# Altium schematic symbol library LATTICEPLDS_Library.SchLib: 291 symbols (part 7 of 32) (continued)
## LCMXO640/1200/2280-FT256/FTN256 (continued)
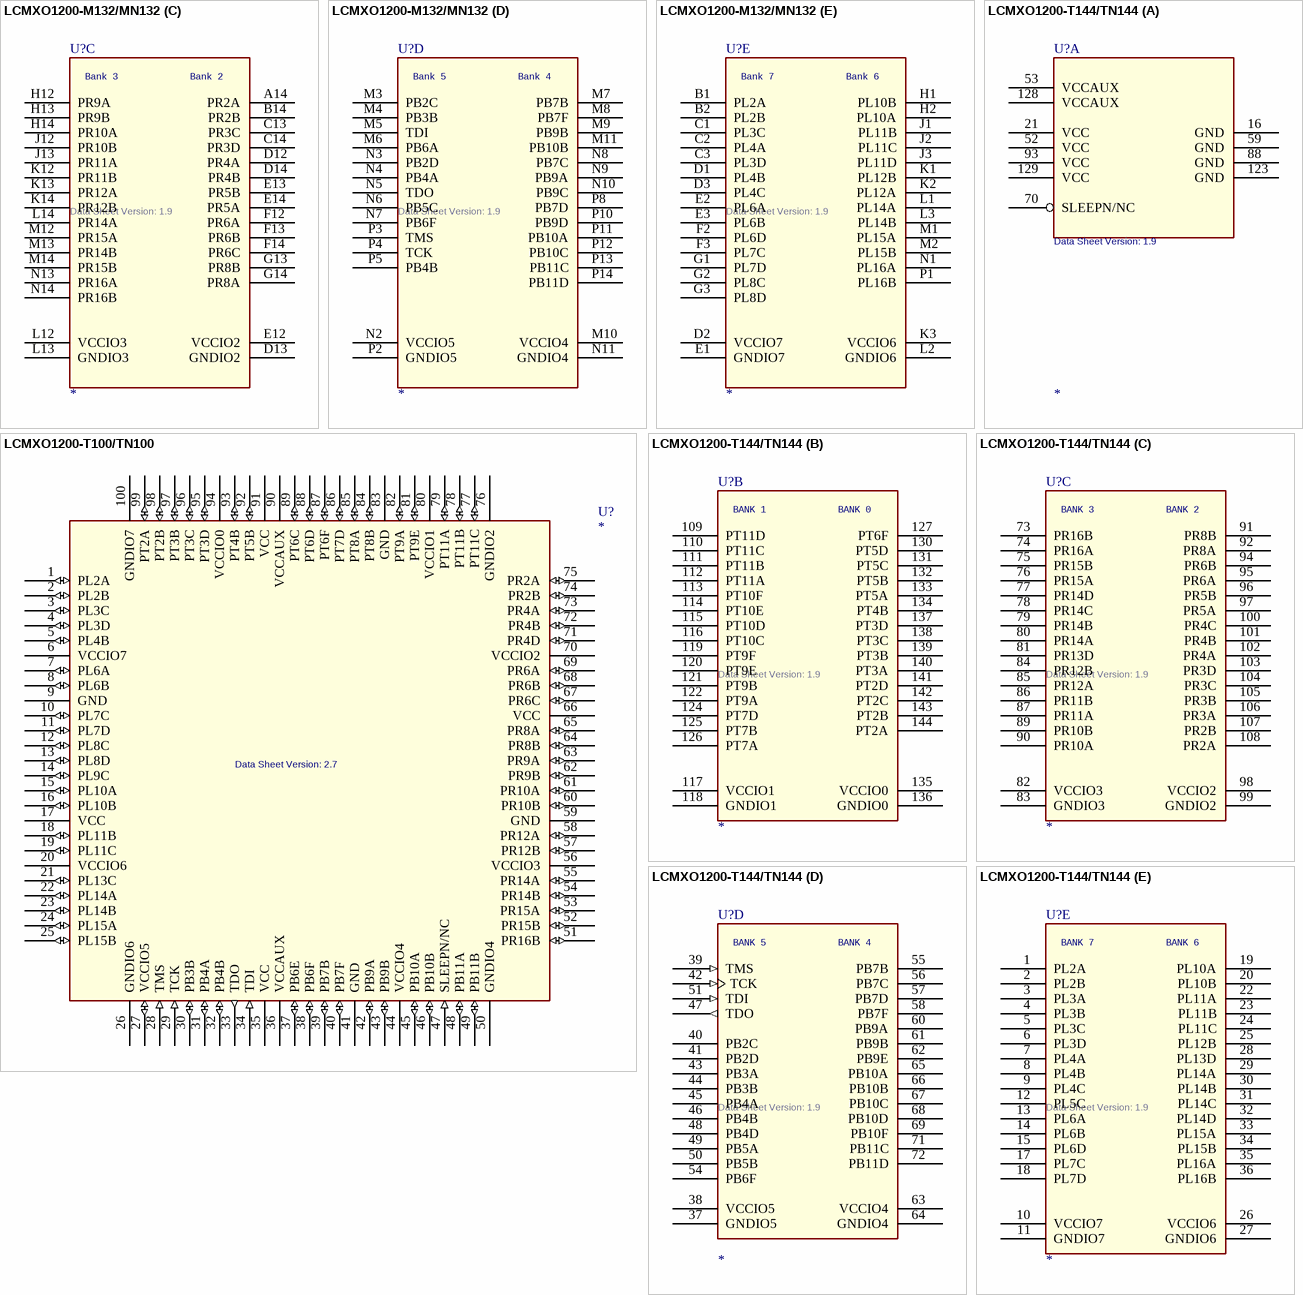
[diagram p72: symbols LCMXO1200-M132/MN132 to LCMXO1200-T144/TN144]
part A text: VCCIO0; VCCIO1; Pin name sequence / PT(640,1200,2280); I/Os in Bank 0 / for XO1200; I/Os in Bank 1 / for XO2280
part B text: VCCIO7; VCCIO6; Pin name sequence / PL(640,1200,2280)
part C text: VCCIO5; VCCIO4; Pin name sequence / PB(640,1200,2280); I/Os in Bank 5 / for XO1200; I/Os in Bank 4 / for XO2280
part D text: VCCIO2; VCCIO3; Pin name sequence / PR(640,1200,2280)
part E text: XO_640 common VCCIO; VCCJ on VCCIO5

## LCMXO1200-M132/MN132
designator U?  Data Sheet Version: 1.9
SWAP_INFO: (S1+S2+S3+S4+S5); SPLIT_INST: TRUE
part A pins: A7 VCCAUX (power), C7 VCC (power), C9 GND (power), F1 GND (power), G12 VCC (power), H3 VCC (power), J14 GND (power), N12 SLEEPN/NC, P6 VCC (power), P7 VCCAUX (power), P9 GND (power)
part B pins: A1 PT2A, A2 PT2B, A3 PT3B, A4 PT3D, A5 PT4B, A6 PT5D, A8 PT7D, A9 PT9A, A10 GNDIO1 (power), A11 PT10D, A12 PT11B, A13 PT11D, B3 PT3A, B4 GNDIO0 (power), B5 PT5A, B6 PT5C, B7 PT6D, B8 PT7B, B9 PT9B, B10 PT9F, B11 VCCIO1, B12 PT10F, B13 PT11C, C4 PT3C, C5 VCCIO0, C6 PT5B, C8 PT6F, C10 PT9E, C11 PT10C, C12 PT11A
part C pins: A14 PR2A, B14 PR2B, C13 PR3C, C14 PR3D, D12 PR4A, D13 GNDIO2 (power), D14 PR4B, E12 VCCIO2, E13 PR5B, E14 PR5A, F12 PR6A, F13 PR6B, F14 PR6C, G13 PR8B, G14 PR8A, H12 PR9A, H13 PR9B, H14 PR10A, J12 PR10B, J13 PR11A, K12 PR11B, K13 PR12A, K14 PR12B, L12 VCCIO3, L13 GNDIO3 (power), L14 PR14A, M12 PR15A, M13 PR14B, M14 PR15B, N13 PR16A, N14 PR16B
part D pins: M3 PB2C, M4 PB3B, M5 TDI, M6 PB6A, M7 PB7B, M8 PB7F, M9 PB9B, M10 VCCIO4, M11 PB10B, N2 VCCIO5, N3 PB2D, N4 PB4A, N5 TDO, N6 PB5C, N7 PB6F, N8 PB7C, N9 PB9A, N10 PB9C, N11 GNDIO4 (power), P2 GNDIO5 (power), P3 TMS, P4 TCK, P5 PB4B, P8 PB7D, P10 PB9D, P11 PB10A, P12 PB10C, P13 PB11C, P14 PB11D
part E pins: B1 PL2A, B2 PL2B, C1 PL3C, C2 PL4A, C3 PL3D, D1 PL4B, D2 VCCIO7, D3 PL4C, E1 GNDIO7 (power), E2 PL6A, E3 PL6B, F2 PL6D, F3 PL7C, G1 PL7D, G2 PL8C, G3 PL8D, H1 PL10B, H2 PL10A, J1 PL11B, J2 PL11C, J3 PL11D, K1 PL12B, K2 PL12A, K3 VCCIO6, L1 PL14A, L2 GNDIO6 (power), L3 PL14B, M1 PL15A, M2 PL15B, N1 PL16A, P1 PL16B
part B text: Bank 1; Bank 0
part C text: Bank 3; Bank 2
part D text: Bank 5; Bank 4
part E text: Bank 7; Bank 6

## LCMXO1200-T100/TN100
designator U?  Data Sheet Version: 2.7
pins: 1 PL2A (io), 2 PL2B (io), 3 PL3C (io), 4 PL3D (io), 5 PL4B (io), 6 VCCIO7 (power), 7 PL6A (io), 8 PL6B (io), 9 GND (power), 10 PL7C (io), 11 PL7D (io), 12 PL8C (io), 13 PL8D (io), 14 PL9C (io), 15 PL10A (io), 16 PL10B (io), 17 VCC (power), 18 PL11B (io), 19 PL11C (io), 20 VCCIO6 (power), 21 PL13C (io), 22 PL14A (io), 23 PL14B (io), 24 PL15A (io), 25 PL15B (io), 26 GNDIO6 (power), 27 VCCIO5 (io), 28 TMS (in), 29 TCK (in), 30 PB3B (io), 31 PB4A (io), 32 PB4B (io), 33 TDO (out), 34 TDI (in), 35 VCC (power), 36 VCCAUX (power), 37 PB6E (io), 38 PB6F (io), 39 PB7B (io), 40 PB7F (io), 41 GND (power), 42 PB9A (io), 43 PB9B (io), 44 VCCIO4 (power), 45 PB10A (io), 46 PB10B (io), 47 SLEEPN/NC (in), 48 PB11A (io), 49 PB11B (io), 50 GNDIO4 (power), 51 PR16B (io), 52 PR15B (io), 53 PR15A (io), 54 PR14B (io), 55 PR14A (io), 56 VCCIO3 (power), 57 PR12B (io), 58 PR12A (io), 59 GND (power), 60 PR10B (io), 61 PR10A (io), 62 PR9B (io), 63 PR9A (io), 64 PR8B (io), 65 PR8A (io), 66 VCC (power), 67 PR6C (io), 68 PR6B (io), 69 PR6A (io), 70 VCCIO2 (power), 71 PR4D (io), 72 PR4B (io), 73 PR4A (io), 74 PR2B (io), 75 PR2A (io), 76 GNDIO2 (power), 77 PT11C (io), 78 PT11B (io), 79 PT11A (io), 80 VCCIO1 (power), 81 PT9E (io), 82 PT9A (io), 83 GND (power), 84 PT8B (io), 85 PT8A (io), 86 PT7D (io), 87 PT6F (io), 88 PT6D (io), 89 PT6C (io), 90 VCCAUX (power), 91 VCC (power), 92 PT5B (io), 93 PT4B (io), 94 VCCIO0 (power), 95 PT3D (io), 96 PT3C (io), 97 PT3B (io), 98 PT2B (io), 99 PT2A (io), 100 GNDIO7 (power)

## LCMXO1200-T144/TN144
designator U?  Data Sheet Version: 1.9
SWAP_INFO: (S1+S2+S3+S4+S5); SPLIT_INST: TRUE
part A pins: 16 GND (power), 21 VCC (power), 52 VCC (power), 53 VCCAUX (power), 59 GND (power), 70 SLEEPN/NC, 88 GND (power), 93 VCC (power), 123 GND (power), 128 VCCAUX (power), 129 VCC (power)
part B pins: 109 PT11D, 110 PT11C, 111 PT11B, 112 PT11A, 113 PT10F, 114 PT10E, 115 PT10D, 116 PT10C, 117 VCCIO1, 118 GNDIO1 (power), 119 PT9F, 120 PT9E, 121 PT9B, 122 PT9A, 124 PT7D, 125 PT7B, 126 PT7A, 127 PT6F, 130 PT5D, 131 PT5C, 132 PT5B, 133 PT5A, 134 PT4B, 135 VCCIO0, 136 GNDIO0 (power), 137 PT3D, 138 PT3C, 139 PT3B, 140 PT3A, 141 PT2D, 142 PT2C, 143 PT2B, 144 PT2A
part C pins: 73 PR16B, 74 PR16A, 75 PR15B, 76 PR15A, 77 PR14D, 78 PR14C, 79 PR14B, 80 PR14A, 81 PR13D, 82 VCCIO3, 83 GNDIO3 (power), 84 PR12B, 85 PR12A, 86 PR11B, 87 PR11A, 89 PR10B, 90 PR10A, 91 PR8B, 92 PR8A, 94 PR6B, 95 PR6A, 96 PR5B, 97 PR5A, 98 VCCIO2, 99 GNDIO2 (power), 100 PR4C, 101 PR4B, 102 PR4A, 103 PR3D, 104 PR3C, 105 PR3B, 106 PR3A, 107 PR2B, 108 PR2A
part D pins: 37 GNDIO5 (power), 38 VCCIO5, 39 TMS (in), 40 PB2C, 41 PB2D, 42 TCK (in), 43 PB3A, 44 PB3B, 45 PB4A, 46 PB4B, 47 TDO (out), 48 PB4D, 49 PB5A, 50 PB5B, 51 TDI (in), 54 PB6F, 55 PB7B, 56 PB7C, 57 PB7D, 58 PB7F, 60 PB9A, 61 PB9B, 62 PB9E, 63 VCCIO4, 64 GNDIO4 (power), 65 PB10A, 66 PB10B, 67 PB10C, 68 PB10D, 69 PB10F, 71 PB11C, 72 PB11D
part E pins: 1 PL2A, 2 PL2B, 3 PL3A, 4 PL3B, 5 PL3C, 6 PL3D, 7 PL4A, 8 PL4B, 9 PL4C, 10 VCCIO7, 11 GNDIO7 (power), 12 PL5C, 13 PL6A, 14 PL6B, 15 PL6D, 17 PL7C, 18 PL7D, 19 PL10A, 20 PL10B, 22 PL11A, 23 PL11B, 24 PL11C, 25 PL12B, 26 VCCIO6, 27 GNDIO6 (power), 28 PL13D, 29 PL14A, 30 PL14B, 31 PL14C, 32 PL14D, 33 PL15A, 34 PL15B, 35 PL16A, 36 PL16B
part B text: BANK 1; BANK 0
part C text: BANK 3; BANK 2
part D text: BANK 5; BANK 4
part E text: BANK 7; BANK 6

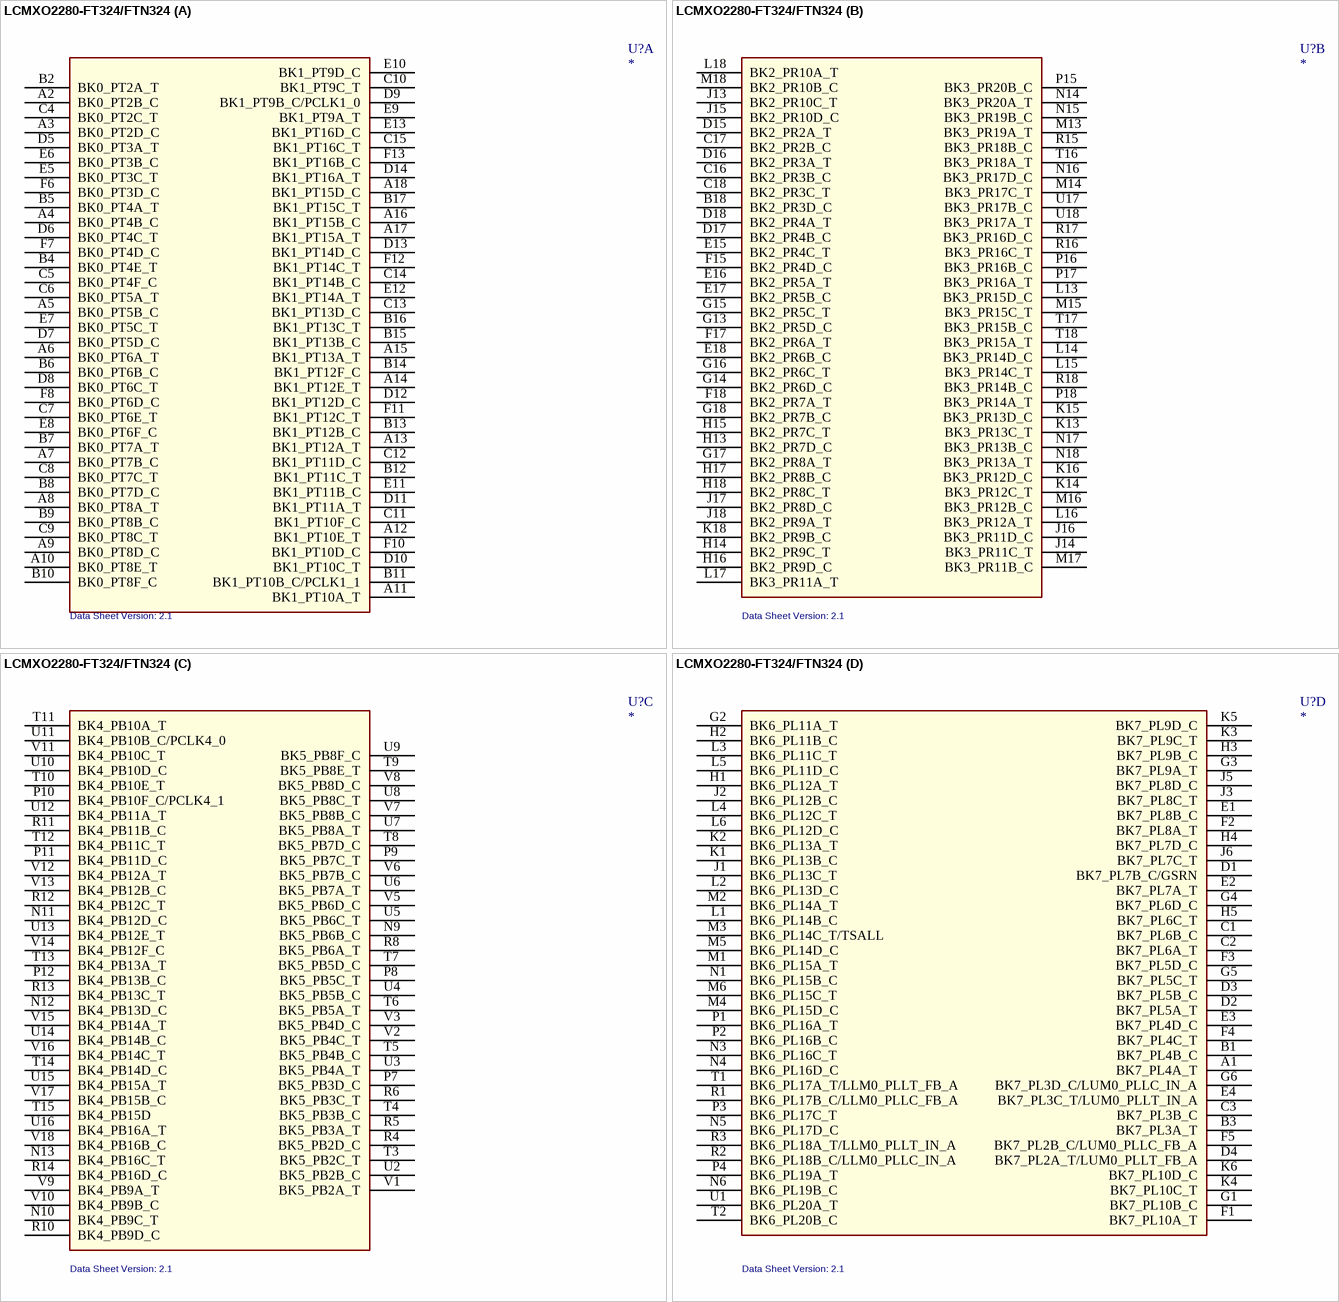
[diagram p73: symbol LCMXO2280-FT324/FTN324]

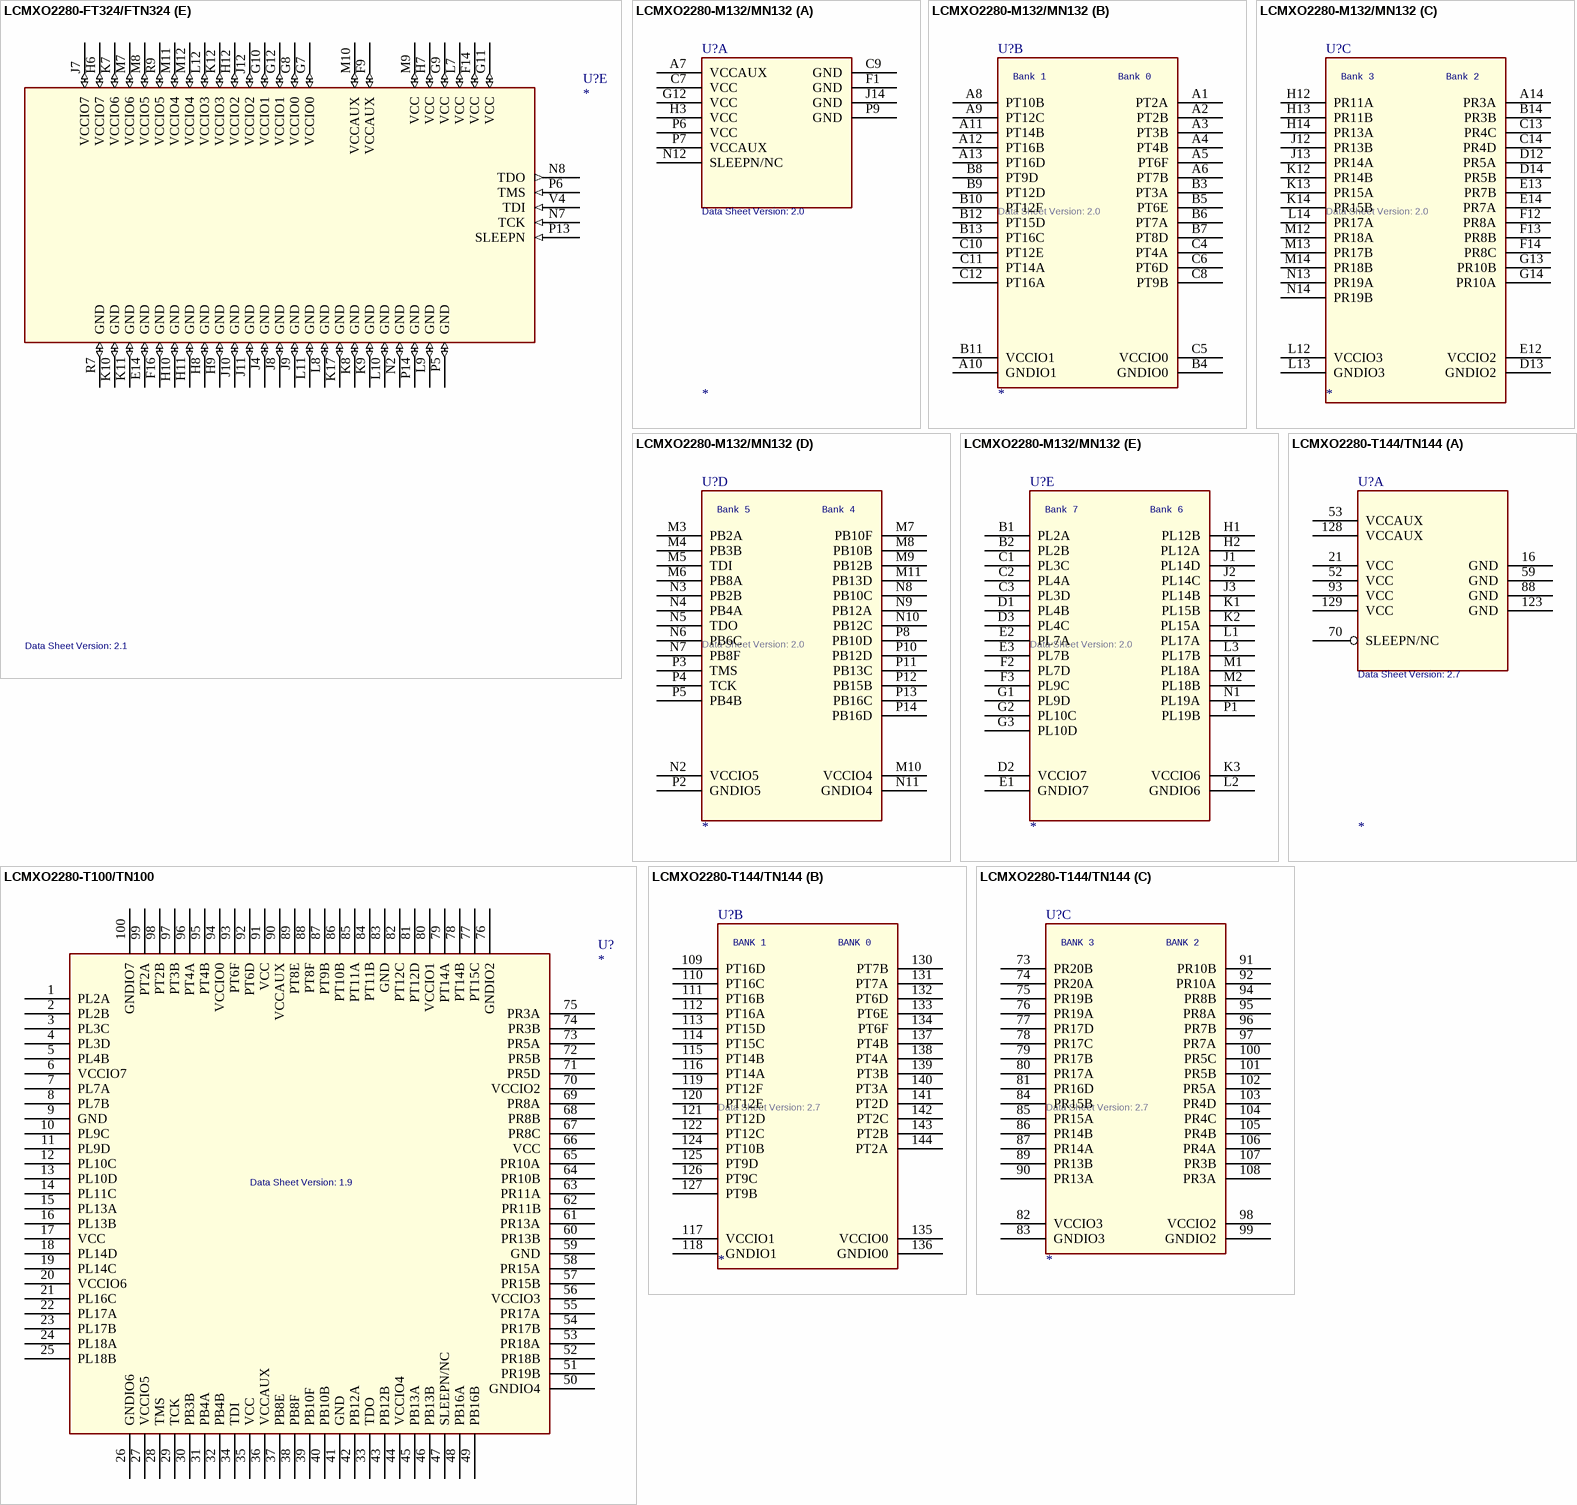
[diagram p74: symbols LCMXO2280-FT324/FTN324 to LCMXO2280-T144/TN144]

## LCMXO2280-FT324/FTN324
designator U?  Data Sheet Version: 2.1
footprint fpBGA324
part A pins: A2 BK0_PT2B_C, A3 BK0_PT2D_C, A4 BK0_PT4B_C, A5 BK0_PT5B_C, A6 BK0_PT6A_T, A7 BK0_PT7B_C, A8 BK0_PT8A_T, A9 BK0_PT8D_C, A10 BK0_PT8E_T, A11 BK1_PT10A_T, A12 BK1_PT10E_T, A13 BK1_PT12A_T, A14 BK1_PT12E_T, A15 BK1_PT13A_T, A16 BK1_PT15B_C, A17 BK1_PT15A_T, A18 BK1_PT15D_C, B2 BK0_PT2A_T, B4 BK0_PT4E_T, B5 BK0_PT4A_T, B6 BK0_PT6B_C, B7 BK0_PT7A_T, B8 BK0_PT7D_C, B9 BK0_PT8B_C, B10 BK0_PT8F_C, B11 BK1_PT10B_C/PCLK1_1, B12 BK1_PT11C_T, B13 BK1_PT12B_C, B14 BK1_PT12F_C, B15 BK1_PT13B_C, B16 BK1_PT13C_T, B17 BK1_PT15C_T, C4 BK0_PT2C_T, C5 BK0_PT4F_C, C6 BK0_PT5A_T, C7 BK0_PT6E_T, C8 BK0_PT7C_T, C9 BK0_PT8C_T, C10 BK1_PT9C_T, C11 BK1_PT10F_C, C12 BK1_PT11D_C, C13 BK1_PT13D_C, C14 BK1_PT14B_C, C15 BK1_PT16C_T, D5 BK0_PT3A_T, D6 BK0_PT4C_T, D7 BK0_PT5D_C, D8 BK0_PT6C_T, D9 BK1_PT9B_C/PCLK1_0, D10 BK1_PT10C_T, D11 BK1_PT11A_T, D12 BK1_PT12D_C, D13 BK1_PT14D_C, D14 BK1_PT16A_T, E5 BK0_PT3C_T, E6 BK0_PT3B_C, E7 BK0_PT5C_T, E8 BK0_PT6F_C, E9 BK1_PT9A_T, E10 BK1_PT9D_C, E11 BK1_PT11B_C, E12 BK1_PT14A_T, E13 BK1_PT16D_C, F6 BK0_PT3D_C, F7 BK0_PT4D_C, F8 BK0_PT6D_C, F10 BK1_PT10D_C, F11 BK1_PT12C_T, F12 BK1_PT14C_T, F13 BK1_PT16B_C
part B pins: B18 BK2_PR3D_C, C16 BK2_PR3B_C, C17 BK2_PR2B_C, C18 BK2_PR3C_T, D15 BK2_PR2A_T, D16 BK2_PR3A_T, D17 BK2_PR4B_C, D18 BK2_PR4A_T, E15 BK2_PR4C_T, E16 BK2_PR5A_T, E17 BK2_PR5B_C, E18 BK2_PR6B_C, F15 BK2_PR4D_C, F17 BK2_PR6A_T, F18 BK2_PR7A_T, G13 BK2_PR5D_C, G14 BK2_PR6D_C, G15 BK2_PR5C_T, G16 BK2_PR6C_T, G17 BK2_PR8A_T, G18 BK2_PR7B_C, H13 BK2_PR7D_C, H14 BK2_PR9C_T, H15 BK2_PR7C_T, H16 BK2_PR9D_C, H17 BK2_PR8B_C, H18 BK2_PR8C_T, J13 BK2_PR10C_T, J14 BK3_PR11C_T, J15 BK2_PR10D_C, J16 BK3_PR11D_C, J17 BK2_PR8D_C, J18 BK2_PR9A_T, K13 BK3_PR13C_T, K14 BK3_PR12C_T, K15 BK3_PR13D_C, K16 BK3_PR12D_C, K18 BK2_PR9B_C, L13 BK3_PR15D_C, L14 BK3_PR14D_C, L15 BK3_PR14C_T, L16 BK3_PR12A_T, L17 BK3_PR11A_T, L18 BK2_PR10A_T, M13 BK3_PR19A_T, M14 BK3_PR17C_T, M15 BK3_PR15C_T, M16 BK3_PR12B_C, M17 BK3_PR11B_C, M18 BK2_PR10B_C, N14 BK3_PR20A_T, N15 BK3_PR19B_C, N16 BK3_PR17D_C, N17 BK3_PR13B_C, N18 BK3_PR13A_T, P15 BK3_PR20B_C, P16 BK3_PR16B_C, P17 BK3_PR16A_T, P18 BK3_PR14A_T, R15 BK3_PR18B_C, R16 BK3_PR16C_T, R17 BK3_PR16D_C, R18 BK3_PR14B_C, T16 BK3_PR18A_T, T17 BK3_PR15B_C, T18 BK3_PR15A_T, U17 BK3_PR17B_C, U18 BK3_PR17A_T
part C pins: N9 BK5_PB6B_C, N10 BK4_PB9C_T, N11 BK4_PB12D_C, N12 BK4_PB13D_C, N13 BK4_PB16C_T, P7 BK5_PB3D_C, P8 BK5_PB5C_T, P9 BK5_PB7C_T, P10 BK4_PB10F_C/PCLK4_1, P11 BK4_PB11D_C, P12 BK4_PB13B_C, R4 BK5_PB2D_C, R5 BK5_PB3A_T, R6 BK5_PB3C_T, R8 BK5_PB6A_T, R10 BK4_PB9D_C, R11 BK4_PB11B_C, R12 BK4_PB12C_T, R13 BK4_PB13C_T, R14 BK4_PB16D_C, T3 BK5_PB2C_T, T4 BK5_PB3B_C, T5 BK5_PB4B_C, T6 BK5_PB5A_T, T7 BK5_PB5D_C, T8 BK5_PB7D_C, T9 BK5_PB8E_T, T10 BK4_PB10E_T, T11 BK4_PB10A_T, T12 BK4_PB11C_T, T13 BK4_PB13A_T, T14 BK4_PB14D_C, T15 BK4_PB15D, U2 BK5_PB2B_C, U3 BK5_PB4A_T, U4 BK5_PB5B_C, U5 BK5_PB6C_T, U6 BK5_PB7A_T, U7 BK5_PB8A_T, U8 BK5_PB8C_T, U9 BK5_PB8F_C, U10 BK4_PB10D_C, U11 BK4_PB10B_C/PCLK4_0, U12 BK4_PB11A_T, U13 BK4_PB12E_T, U14 BK4_PB14B_C, U15 BK4_PB15A_T, U16 BK4_PB16A_T, V1 BK5_PB2A_T, V2 BK5_PB4C_T, V3 BK5_PB4D_C, V5 BK5_PB6D_C, V6 BK5_PB7B_C, V7 BK5_PB8B_C, V8 BK5_PB8D_C, V9 BK4_PB9A_T, V10 BK4_PB9B_C, V11 BK4_PB10C_T, V12 BK4_PB12A_T, V13 BK4_PB12B_C, V14 BK4_PB12F_C, V15 BK4_PB14A_T, V16 BK4_PB14C_T, V17 BK4_PB15B_C, V18 BK4_PB16B_C
part D pins: A1 BK7_PL4A_T, B1 BK7_PL4B_C, B3 BK7_PL3A_T, C1 BK7_PL6B_C, C2 BK7_PL6A_T, C3 BK7_PL3B_C, D1 BK7_PL7B_C/GSRN, D2 BK7_PL5A_T, D3 BK7_PL5B_C, D4 BK7_PL2A_T/LUM0_PLLT_FB_A, E1 BK7_PL8B_C, E2 BK7_PL7A_T, E3 BK7_PL4D_C, E4 BK7_PL3C_T/LUM0_PLLT_IN_A, F1 BK7_PL10A_T, F2 BK7_PL8A_T, F3 BK7_PL5D_C, F4 BK7_PL4C_T, F5 BK7_PL2B_C/LUM0_PLLC_FB_A, G1 BK7_PL10B_C, G2 BK6_PL11A_T, G3 BK7_PL9A_T, G4 BK7_PL6D_C, G5 BK7_PL5C_T, G6 BK7_PL3D_C/LUM0_PLLC_IN_A, H1 BK6_PL12A_T, H2 BK6_PL11B_C, H3 BK7_PL9B_C, H4 BK7_PL7D_C, H5 BK7_PL6C_T, J1 BK6_PL13C_T, J2 BK6_PL12B_C, J3 BK7_PL8C_T, J5 BK7_PL8D_C, J6 BK7_PL7C_T, K1 BK6_PL13B_C, K2 BK6_PL13A_T, K3 BK7_PL9C_T, K4 BK7_PL10C_T, K5 BK7_PL9D_C, K6 BK7_PL10D_C, L1 BK6_PL14B_C, L2 BK6_PL13D_C, L3 BK6_PL11C_T, L4 BK6_PL12C_T, L5 BK6_PL11D_C, L6 BK6_PL12D_C, M1 BK6_PL15A_T, M2 BK6_PL14A_T, M3 BK6_PL14C_T/TSALL, M4 BK6_PL15D_C, M5 BK6_PL14D_C, M6 BK6_PL15C_T, N1 BK6_PL15B_C, N3 BK6_PL16C_T, N4 BK6_PL16D_C, N5 BK6_PL17D_C, N6 BK6_PL19B_C, P1 BK6_PL16A_T, P2 BK6_PL16B_C, P3 BK6_PL17C_T, P4 BK6_PL19A_T, R1 BK6_PL17B_C/LLM0_PLLC_FB_A, R2 BK6_PL18B_C/LLM0_PLLC_IN_A, R3 BK6_PL18A_T/LLM0_PLLT_IN_A, T1 BK6_PL17A_T/LLM0_PLLT_FB_A, T2 BK6_PL20B_C, U1 BK6_PL20A_T
part E pins: E14 GND (io), F9 VCCAUX (io), F14 VCC (io), F16 GND (io), G7 VCCIO0 (io), G8 VCCIO0 (io), G9 VCC (io), G10 VCCIO1 (io), G11 VCC (io), G12 VCCIO1 (io), H6 VCCIO7 (io), H7 VCC (io), H8 GND (io), H9 GND (io), H10 GND (io), H11 GND (io), H12 VCCIO2 (io), J4 GND (io), J7 VCCIO7 (io), J8 GND (io), J9 GND (io), J10 GND (io), J11 GND (io), J12 VCCIO2 (io), K7 VCCIO6 (io), K8 GND (io), K9 GND (io), K10 GND (io), K11 GND (io), K12 VCCIO3 (io), K17 GND (io), L7 VCC (io), L8 GND (io), L9 GND (io), L10 GND (io), L11 GND (io), L12 VCCIO3 (io), M7 VCCIO6 (io), M8 VCCIO5 (io), M9 VCC (io), M10 VCCAUX (io), M11 VCCIO4 (io), M12 VCCIO4 (io), N2 GND (io), N7 TCK (in), N8 TDO (out), P5 GND (io), P6 TMS (in), P13 SLEEPN (in), P14 GND (io), R7 GND (io), R9 VCCIO5 (io), V4 TDI (in)

## LCMXO2280-M132/MN132
designator U?  Data Sheet Version: 2.0
SWAP_INFO: (S1+S2+S3+S4+S5); SPLIT_INST: TRUE
part A pins: A7 VCCAUX (power), C7 VCC (power), C9 GND (power), F1 GND (power), G12 VCC (power), H3 VCC (power), J14 GND (power), N12 SLEEPN/NC, P6 VCC (power), P7 VCCAUX (power), P9 GND (power)
part B pins: A1 PT2A, A2 PT2B, A3 PT3B, A4 PT4B, A5 PT6F, A6 PT7B, A8 PT10B, A9 PT12C, A10 GNDIO1 (power), A11 PT14B, A12 PT16B, A13 PT16D, B3 PT3A, B4 GNDIO0 (power), B5 PT6E, B6 PT7A, B7 PT8D, B8 PT9D, B9 PT12D, B10 PT12F, B11 VCCIO1, B12 PT15D, B13 PT16C, C4 PT4A, C5 VCCIO0, C6 PT6D, C8 PT9B, C10 PT12E, C11 PT14A, C12 PT16A
part C pins: A14 PR3A, B14 PR3B, C13 PR4C, C14 PR4D, D12 PR5A, D13 GNDIO2 (power), D14 PR5B, E12 VCCIO2, E13 PR7B, E14 PR7A, F12 PR8A, F13 PR8B, F14 PR8C, G13 PR10B, G14 PR10A, H12 PR11A, H13 PR11B, H14 PR13A, J12 PR13B, J13 PR14A, K12 PR14B, K13 PR15A, K14 PR15B, L12 VCCIO3, L13 GNDIO3 (power), L14 PR17A, M12 PR18A, M13 PR17B, M14 PR18B, N13 PR19A, N14 PR19B
part D pins: M3 PB2A, M4 PB3B, M5 TDI, M6 PB8A, M7 PB10F, M8 PB10B, M9 PB12B, M10 VCCIO4, M11 PB13D, N2 VCCIO5, N3 PB2B, N4 PB4A, N5 TDO, N6 PB6C, N7 PB8F, N8 PB10C, N9 PB12A, N10 PB12C, N11 GNDIO4 (power), P2 GNDIO5 (power), P3 TMS, P4 TCK, P5 PB4B, P8 PB10D, P10 PB12D, P11 PB13C, P12 PB15B, P13 PB16C, P14 PB16D
part E pins: B1 PL2A, B2 PL2B, C1 PL3C, C2 PL4A, C3 PL3D, D1 PL4B, D2 VCCIO7, D3 PL4C, E1 GNDIO7 (power), E2 PL7A, E3 PL7B, F2 PL7D, F3 PL9C, G1 PL9D, G2 PL10C, G3 PL10D, H1 PL12B, H2 PL12A, J1 PL14D, J2 PL14C, J3 PL14B, K1 PL15B, K2 PL15A, K3 VCCIO6, L1 PL17A, L2 GNDIO6 (power), L3 PL17B, M1 PL18A, M2 PL18B, N1 PL19A, P1 PL19B
part B text: Bank 1; Bank 0
part C text: Bank 3; Bank 2
part D text: Bank 5; Bank 4
part E text: Bank 7; Bank 6

## LCMXO2280-T100/TN100
designator U?  Data Sheet Version: 1.9
pins: 1 PL2A, 2 PL2B, 3 PL3C, 4 PL3D, 5 PL4B, 6 VCCIO7 (power), 7 PL7A, 8 PL7B, 9 GND (power), 10 PL9C, 11 PL9D, 12 PL10C, 13 PL10D, 14 PL11C, 15 PL13A, 16 PL13B, 17 VCC (power), 18 PL14D, 19 PL14C, 20 VCCIO6 (power), 21 PL16C, 22 PL17A, 23 PL17B, 24 PL18A, 25 PL18B, 26 GNDIO6 (power), 27 VCCIO5 (power), 28 TMS, 29 TCK, 30 PB3B, 31 PB4A, 32 PB4B, 33 TDO, 34 TDI, 35 VCC (power), 36 VCCAUX (power), 37 PB8E, 38 PB8F, 39 PB10F, 40 PB10B, 41 GND (power), 42 PB12A, 43 PB12B, 44 VCCIO4 (power), 45 PB13A, 46 PB13B, 47 SLEEPN/NC, 48 PB16A, 49 PB16B, 50 GNDIO4 (power), 51 PR19B, 52 PR18B, 53 PR18A, 54 PR17B, 55 PR17A, 56 VCCIO3 (power), 57 PR15B, 58 PR15A, 59 GND (power), 60 PR13B, 61 PR13A, 62 PR11B, 63 PR11A, 64 PR10B, 65 PR10A, 66 VCC (power), 67 PR8C, 68 PR8B, 69 PR8A, 70 VCCIO2 (power), 71 PR5D, 72 PR5B, 73 PR5A, 74 PR3B, 75 PR3A, 76 GNDIO2 (power), 77 PT15C, 78 PT14B, 79 PT14A, 80 VCCIO1 (power), 81 PT12D, 82 PT12C, 83 GND (power), 84 PT11B, 85 PT11A, 86 PT10B, 87 PT9B, 88 PT8F, 89 PT8E, 90 VCCAUX (power), 91 VCC (power), 92 PT6D, 93 PT6F, 94 VCCIO0 (power), 95 PT4B, 96 PT4A, 97 PT3B, 98 PT2B, 99 PT2A, 100 GNDIO7 (power)

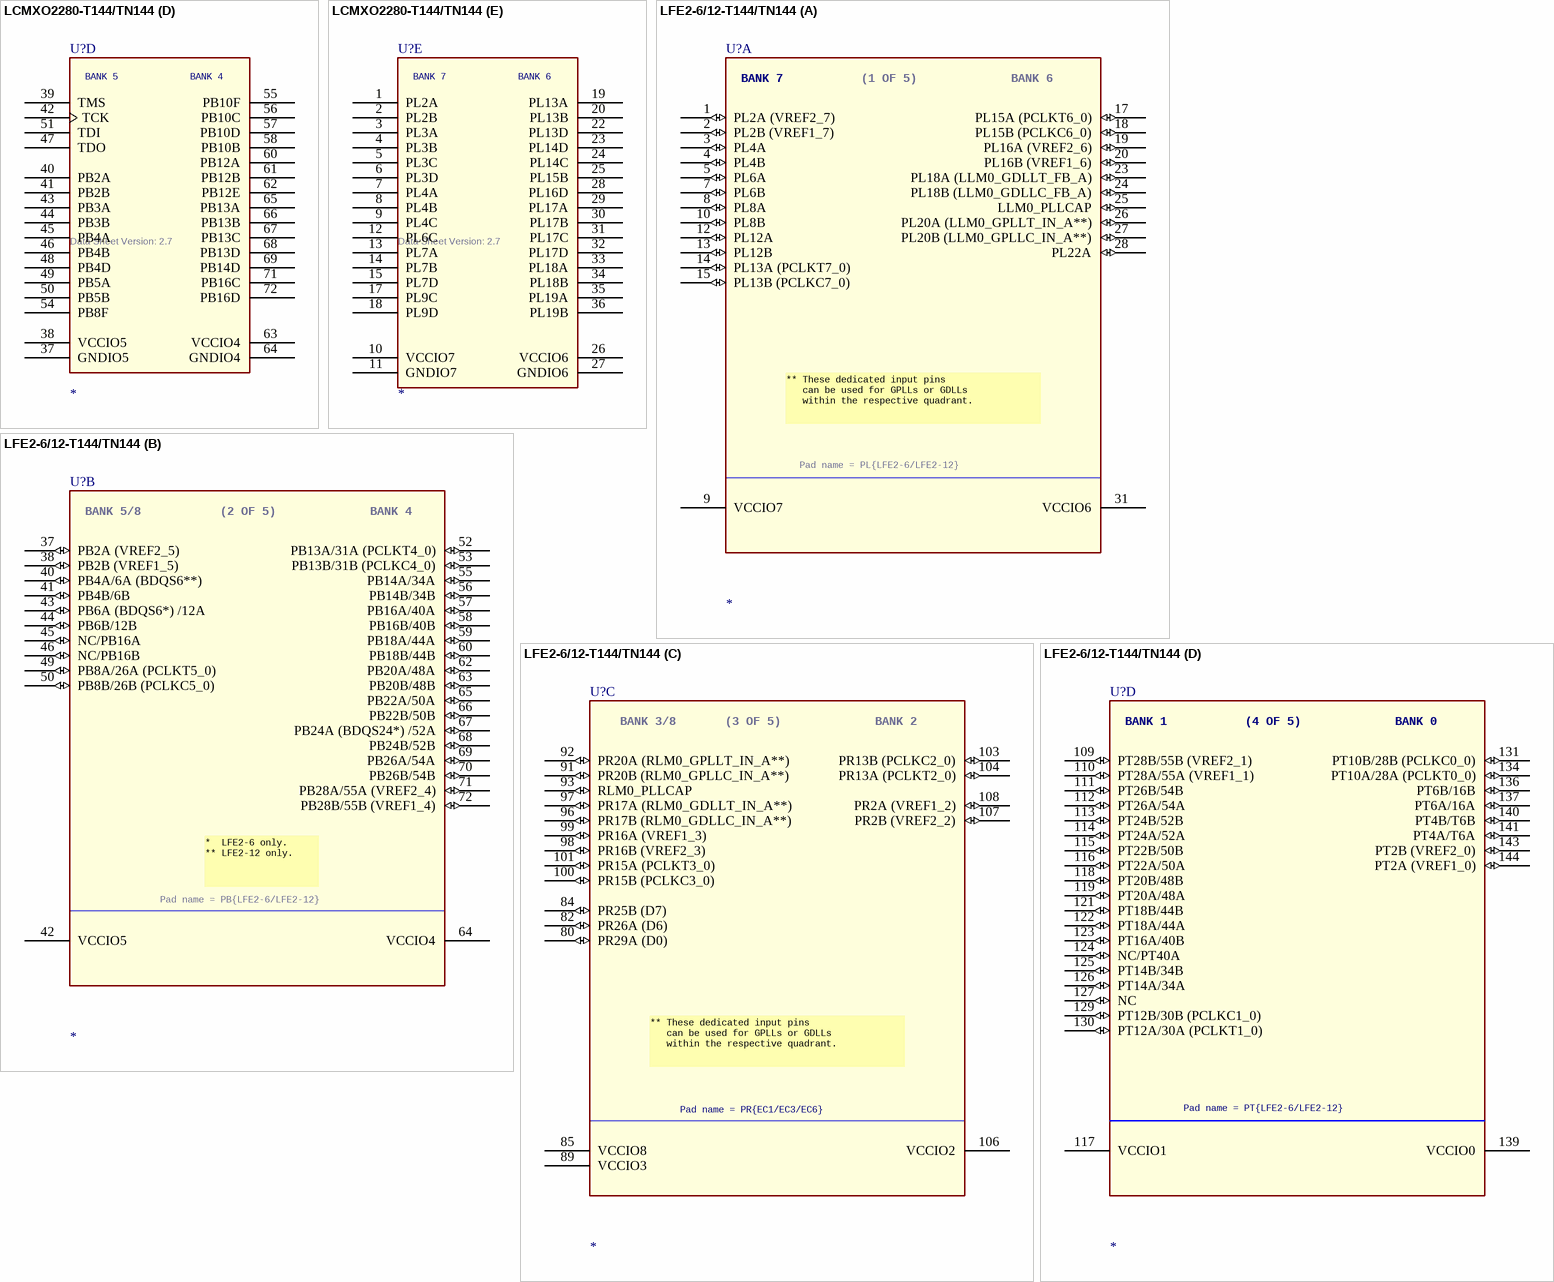
[diagram p75: symbols LCMXO2280-T144/TN144 to LFE2-6/12-T144/TN144]

## LCMXO2280-T144/TN144
designator U?  Data Sheet Version: 2.7
SPLIT_INST: TRUE; SWAP_INFO: (S1+S2+S3+S4+S5)
part A pins: 16 GND (power), 21 VCC (power), 52 VCC (power), 53 VCCAUX (power), 59 GND (power), 70 SLEEPN/NC, 88 GND (power), 93 VCC (power), 123 GND (power), 128 VCCAUX (power), 129 VCC (power)
part B pins: 109 PT16D, 110 PT16C, 111 PT16B, 112 PT16A, 113 PT15D, 114 PT15C, 115 PT14B, 116 PT14A, 117 VCCIO1, 118 GNDIO1 (power), 119 PT12F, 120 PT12E, 121 PT12D, 122 PT12C, 124 PT10B, 125 PT9D, 126 PT9C, 127 PT9B, 130 PT7B, 131 PT7A, 132 PT6D, 133 PT6E, 134 PT6F, 135 VCCIO0, 136 GNDIO0 (power), 137 PT4B, 138 PT4A, 139 PT3B, 140 PT3A, 141 PT2D, 142 PT2C, 143 PT2B, 144 PT2A
part C pins: 73 PR20B, 74 PR20A, 75 PR19B, 76 PR19A, 77 PR17D, 78 PR17C, 79 PR17B, 80 PR17A, 81 PR16D, 82 VCCIO3, 83 GNDIO3 (power), 84 PR15B, 85 PR15A, 86 PR14B, 87 PR14A, 89 PR13B, 90 PR13A, 91 PR10B, 92 PR10A, 94 PR8B, 95 PR8A, 96 PR7B, 97 PR7A, 98 VCCIO2, 99 GNDIO2 (power), 100 PR5C, 101 PR5B, 102 PR5A, 103 PR4D, 104 PR4C, 105 PR4B, 106 PR4A, 107 PR3B, 108 PR3A
part D pins: 37 GNDIO5 (power), 38 VCCIO5, 39 TMS, 40 PB2A, 41 PB2B, 42 TCK, 43 PB3A, 44 PB3B, 45 PB4A, 46 PB4B, 47 TDO, 48 PB4D, 49 PB5A, 50 PB5B, 51 TDI, 54 PB8F, 55 PB10F, 56 PB10C, 57 PB10D, 58 PB10B, 60 PB12A, 61 PB12B, 62 PB12E, 63 VCCIO4, 64 GNDIO4 (power), 65 PB13A, 66 PB13B, 67 PB13C, 68 PB13D, 69 PB14D, 71 PB16C, 72 PB16D
part E pins: 1 PL2A, 2 PL2B, 3 PL3A, 4 PL3B, 5 PL3C, 6 PL3D, 7 PL4A, 8 PL4B, 9 PL4C, 10 VCCIO7, 11 GNDIO7 (power), 12 PL6C, 13 PL7A, 14 PL7B, 15 PL7D, 17 PL9C, 18 PL9D, 19 PL13A, 20 PL13B, 22 PL13D, 23 PL14D, 24 PL14C, 25 PL15B, 26 VCCIO6, 27 GNDIO6 (power), 28 PL16D, 29 PL17A, 30 PL17B, 31 PL17C, 32 PL17D, 33 PL18A, 34 PL18B, 35 PL19A, 36 PL19B
part B text: BANK 1; BANK 0
part C text: BANK 3; BANK 2
part D text: BANK 5; BANK 4
part E text: BANK 7; BANK 6

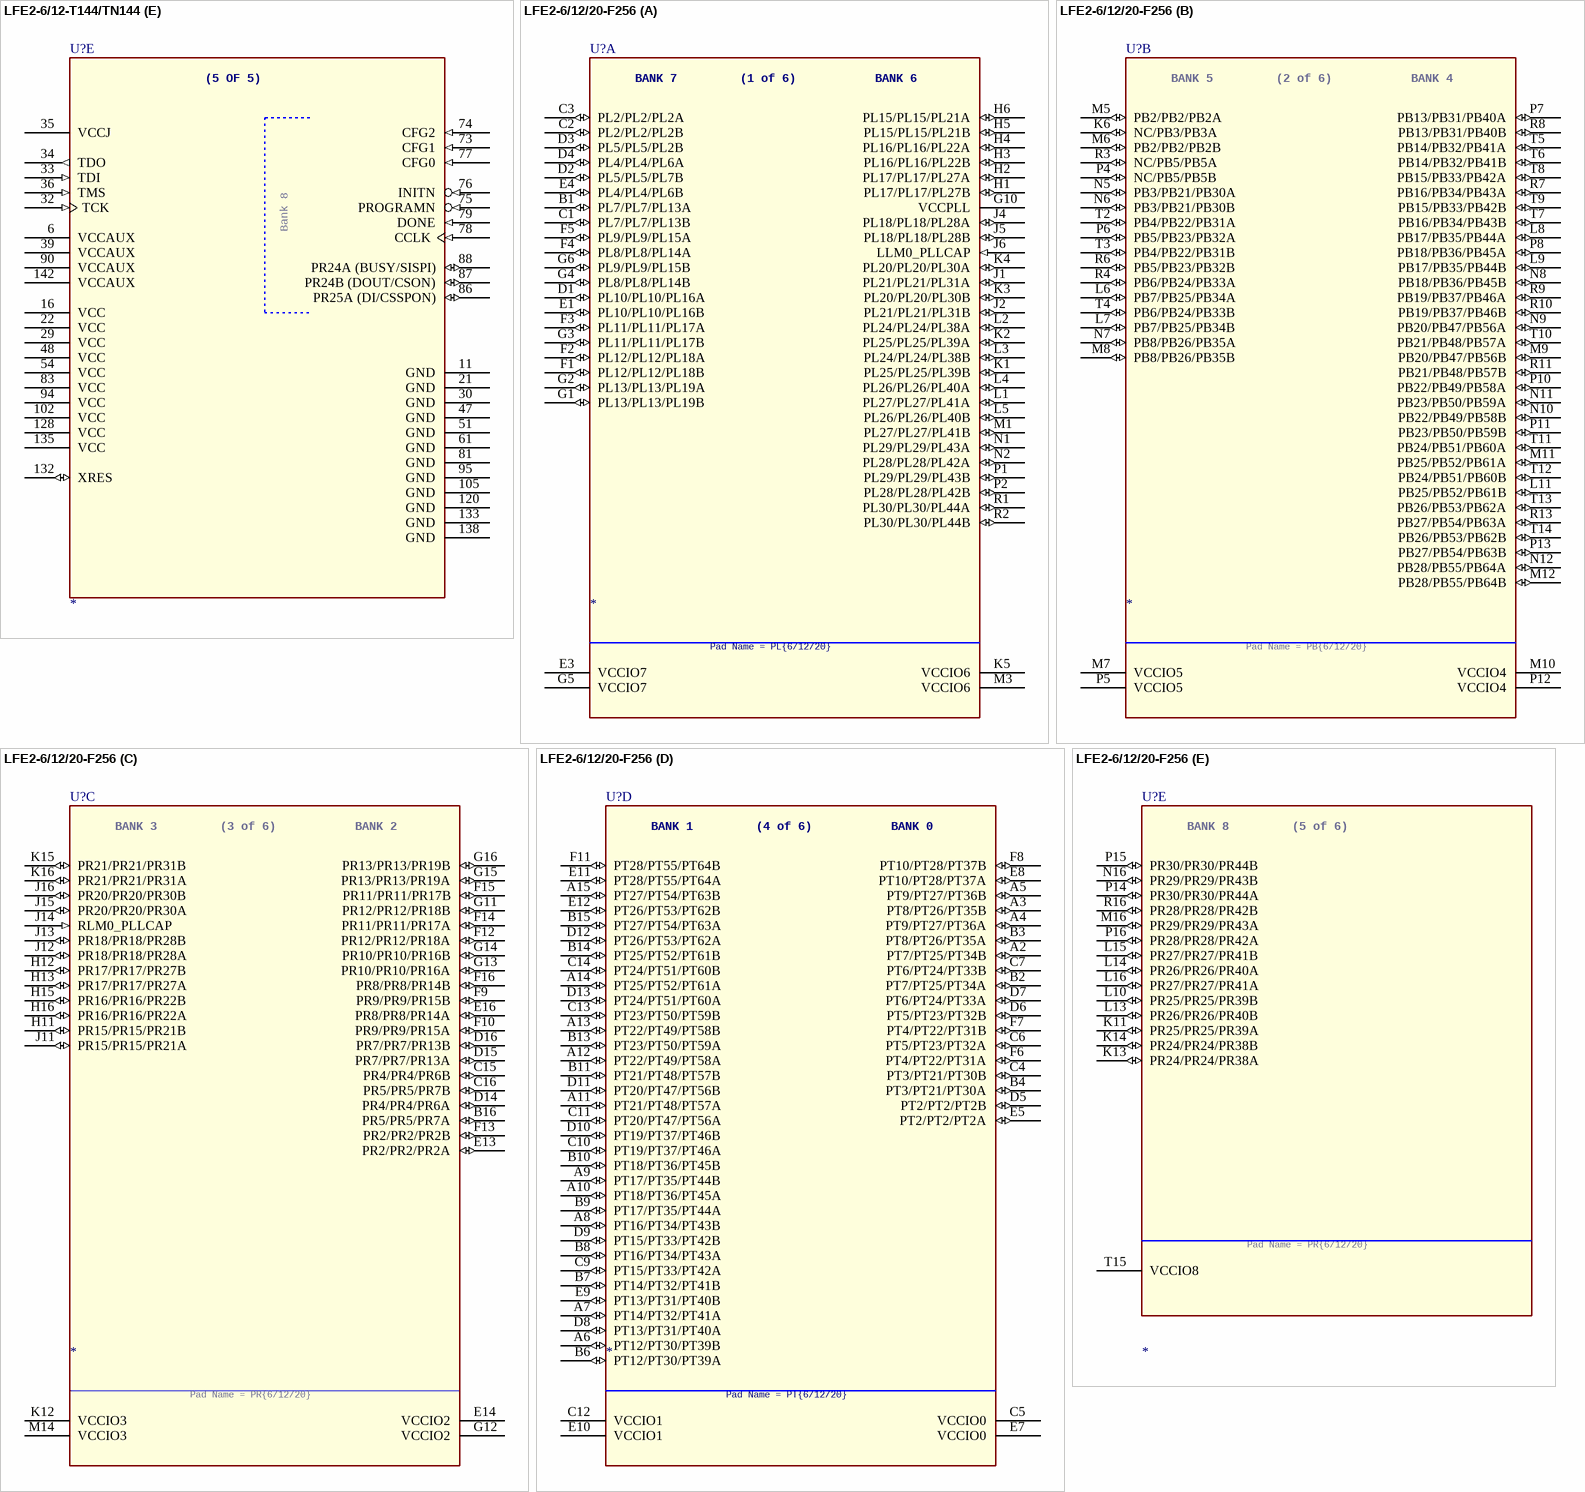
[diagram p76: symbols LFE2-6/12-T144/TN144 to LFE2-6/12/20-F256]